# Altium footprint library UWRT_Footprint_Library_2020.PcbLib: 376 footprints (part 17 of 24)
Each footprint in its own frame and in the unit in brackets; x right, y up, seen from the top. Pads: shape width x height; smd on the part's side, far side on the other; paste and mask are expansions set on the pad; w line width, h text height; cw(c..) or ccw(c..) is an arc to the next point about the centre after c.
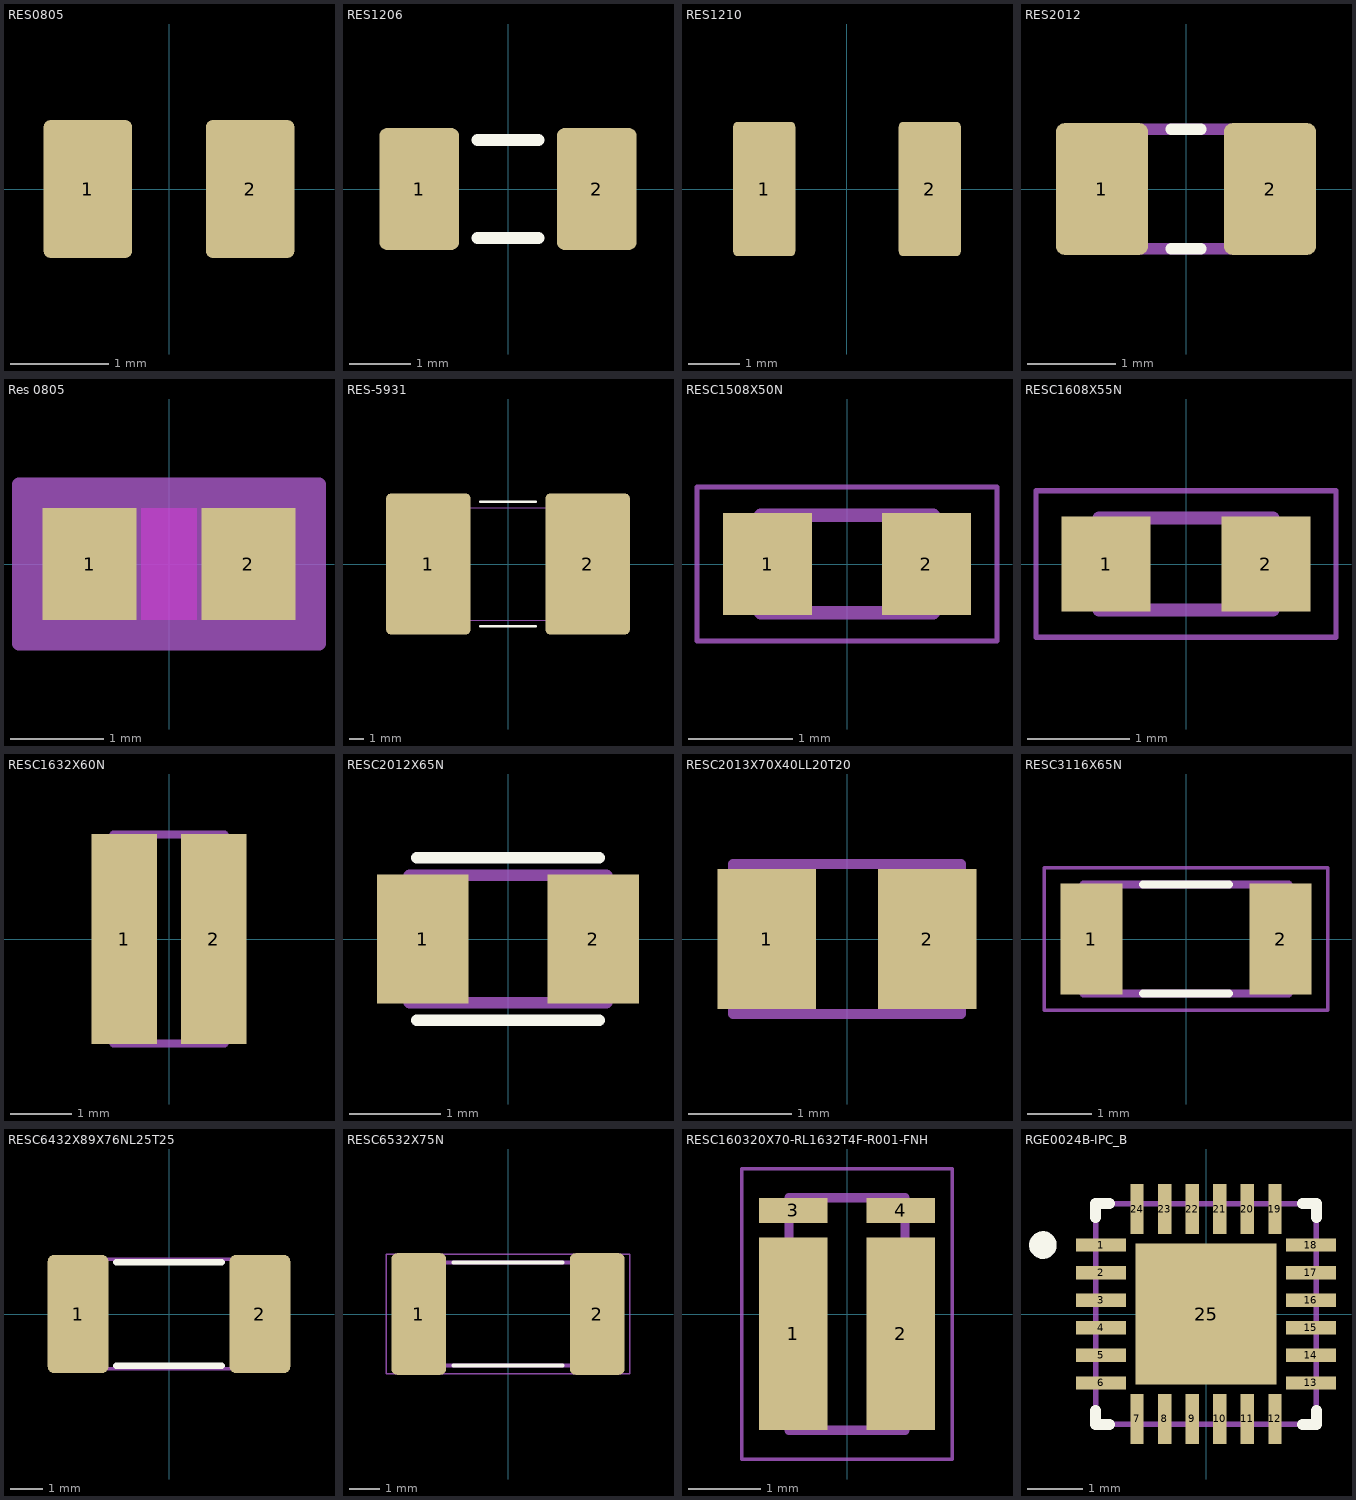
[diagram p16: the footprints below, top view; thin cyan lines are the x and y axes]

## RES0805 [mm] "Chip Resistor, 2-Leads, Body 2.00x1.25mm, IPC High Density"
height 0.5
pads (2):
  rrect15% 0.9x1.4 smd: 1(-0.825,0) 2(0.825,0)
3D body "0805 resistor.step": height 0.61, standoff 0.01, extent -1,-0.625 1,0.625

## RES1206 [mm] "Chip Resistor, Body 3.2x1.6mm, IPC Medium Density"
height 0.75
pads (2):
  rrect20% 1.3x2 smd: 1(-1.45,0) 2(1.45,0)
Top Overlay:
  lines w0.2: -0.5,-0.8 0.5,-0.8 ; -0.5,0.8 0.5,0.8
3D body "1206 resistor.step": height 0.61, standoff 0.01, extent -1.6,-0.8 1.6,0.8

## RES1210 [mm] "Chip Resistor, Body 3.20x2.50mm"
pads (2):
  rrect15% 1.2x2.6 smd: 1(-1.6,0) 2(1.6,0)
3D body "User Library-R_1210.sldprt": height 0.6, standoff 0, extent -1.6,-1.25 1.6,1.25

## RES2012 [mm]
pads (2):
  rrect20% 1.05x1.5 smd: 1(-0.955,0) 2(0.955,0)
Top Overlay:
  lines w0.127: -0.17,-0.68 0.17,-0.68 ; -0.17,0.68 0.17,0.68
Mechanical 4:
  lines w0.127: -1.05,-0.68 -1.05,0.68 ; -1.05,-0.68 1.05,-0.68 ; -1.05,-0.68 -1.05,0.68 ; -1.05,-0.68 1.05,-0.68 ; -1.05,0.68 1.05,0.68 ; -1.05,0.68 1.05,0.68 ; 1.05,-0.68 1.05,0.68 ; 1.05,-0.68 1.05,0.68
3D body "0805 resistor.STEP": height 0.6, standoff 0, extent -1,-0.625 1,0.625

## Res 0805 [mm]
pads (2):
  rect 1.006x1.2 smd paste+0 mask+0: 1(-0.853,0) 2(0.853,0)
Top Layer keep-out:
  region: -0.299,-0.549 -0.299,0.549 0.299,0.549 0.299,-0.549
Keep-Out Layer:
  region: -0.299,-0.6 -0.299,0.6 0.299,0.6 0.299,-0.6
Mechanical 13:
  lines w0.025: -1,-0.6 -1,0.6 ; -1,-0.6 1,-0.6 ; -1,-0.6 -0.35,-0.6 -0.35,0.6 -1,0.6 ; -1,-0.6 -1,0.6 ; -1,0.6 1,0.6 ; 1,-0.6 1,0.6 ; 1,-0.6 1,0.6 ; 1,-0.6 0.35,-0.6 0.35,0.6 1,0.6
Mechanical 15:
  region: 1.61,-0.854 -1.61,-0.854 -1.61,0.854 1.61,0.854
  lines w0.152: -1.61,-0.854 1.61,-0.854 1.61,0.854 -1.61,0.854 -1.61,-0.854
3D body "RC0805N_VIS.step": height 0.71, standoff 0, extent -1,-0.6 1,0.6

## RES-5931 [mm]
pads (2):
  rrect10% 6x10 smd paste+0 mask+0: 1(-5.664,0) 2(5.664,0)
Top Overlay:
  lines w0.152: -2,-4.427 2,-4.427 ; -2,4.427 2,4.427
Mechanical 13:
  circle w0: c-5.537,0 r0.076
  lines w0.025: -7.633,-4 -7.633,4 ; -7.633,-4 7.633,-4 ; -7.633,-4 -3.391,-4 -3.391,4 -7.633,4 ; -7.633,-4 -7.633,4 ; -7.633,4 7.633,4 ; 7.633,-4 7.633,4 ; 7.633,-4 7.633,4 ; 7.633,-4 3.391,-4 3.391,4 7.633,4
3D body "User Library-WSSL5931.step": height 2.36, standoff 0.01, extent -7.5,-3.875 7.5,3.875

## RESC1508X50N [mm]
pads (2):
  rect 0.86x0.98 smd: 1(-0.765,0) 2(0.765,0)
Mechanical 13:
  lines w0.127: -0.83,-0.47 0.83,-0.47 0.83,0.47 -0.83,0.47 -0.83,-0.47
Mechanical 15:
  lines w0.05: -1.444,-0.74 1.444,-0.74 1.444,0.74 -1.444,0.74 -1.444,-0.74

## RESC1608X55N [mm]
pads (2):
  rect 0.87x0.93 smd: 1(-0.78,0) 2(0.78,0)
Mechanical 13:
  lines w0.127: -0.85,-0.45 0.85,-0.45 0.85,0.45 -0.85,0.45 -0.85,-0.45
Mechanical 15:
  lines w0.05: -1.465,-0.715 1.465,-0.715 1.465,0.715 -1.465,0.715 -1.465,-0.715

## RESC1632X60N [mm]
pads (2):
  rect 1.06x3.42 smd: 1(-0.728,0) 2(0.728,0)
Mechanical 13:
  lines w0.127: -0.9,-1.7 0.9,-1.7 0.9,1.7 -0.9,1.7 -0.9,-1.7
3D body "PRL1632-R016-F-T1.STEP": height 0.6, standoff 0, extent -0.798,-1.619 0.802,1.581

## RESC2012X65N [mm]
pads (2):
  rect 1x1.42 smd: 1(-0.935,0) 2(0.935,0)
Top Overlay:
  lines w0.127: -1,-0.89 1,-0.89 ; -1,0.89 1,0.89
Mechanical 4:
  lines w0.127: -1.08,-0.7 1.08,-0.7 ; -1.08,-0.7 -1.08,0.7 ; -1.08,-0.7 1.08,-0.7 ; -1.08,-0.7 -1.08,0.7 ; -1.08,0.7 1.08,0.7 ; -1.08,0.7 1.08,0.7 ; 1.08,-0.7 1.08,0.7 ; 1.08,-0.7 1.08,0.7
3D body "1-1614959-4--3DModel-STEP-56544.STEP": height 0.6, standoff 0, extent -1,-0.625 1,0.625

## RESC2013X70X40LL20T20 [mm] "Chip Resistor, 2-Leads, Body 2.00x1.25mm, IPC High Density"
height 0.7
pads (2):
  rect 0.95x1.35 smd: 1(-0.775,0) 2(0.775,0)
Mechanical 13:
  lines w0.1: -1.1,-0.725 1.1,-0.725 1.1,0.725 -1.1,0.725 -1.1,-0.725
3D body: height 0.7, standoff 0, extent 0.7,-0.725 1.1,0.725
3D body: height 0.7, standoff 0, extent -1.1,-0.725 -0.7,0.725
3D body: height 0.7, standoff 0, extent -0.7,-0.725 0.7,0.725

## RESC3116X65N [mm]
pads (2):
  rect 0.97x1.73 smd: 1(-1.48,0) 2(1.48,0)
Top Overlay:
  lines w0.127: -0.67,-0.85 0.67,-0.85 ; -0.67,0.85 0.67,0.85
Mechanical 13:
  lines w0.127: -1.6,-0.85 -1.6,0.85 1.6,0.85 1.6,-0.85 -1.6,-0.85
Mechanical 15:
  lines w0.05: -2.215,-1.115 -2.215,1.115 2.215,1.115 2.215,-1.115 -2.215,-1.115
3D body "step_temp.STEP": height 0.65, standoff 0, extent -1.55,-0.8 1.55,0.8

## RESC6432X89X76NL25T25 [mm] "Chip Resistor, 2-Leads, Body 6.6x3.43mm, IPC Medium Density"
height 0.89
pads (2):
  rrect20% 1.9x3.7 smd: 1(-2.85,0) 2(2.85,0)
Top Overlay:
  lines w0.2: -1.65,-1.625 1.65,-1.625 ; -1.65,1.625 1.65,1.625
Mechanical 13:
  lines w0.1: -3.3,-1.715 -3.3,1.715 3.3,1.715 3.3,-1.715 -3.3,-1.715
3D body "DIOC6432X09N.step": height 0.89, standoff 0, extent -3.3,-1.715 3.3,1.715

## RESC6532X75N [mm]
pads (2):
  rrect20% 1.8x4 smd: 1(-2.935,0) 2(2.935,0)
Top Overlay:
  lines w0.127: -1.79,-1.7 1.79,-1.7 ; -1.79,1.7 1.79,1.7
Mechanical 4:
  lines w0.127: -3.4,-1.7 3.4,-1.7 ; -3.4,-1.7 -3.4,1.7 ; -3.4,-1.7 3.4,-1.7 ; -3.4,-1.7 -3.4,1.7 ; -3.4,1.7 3.4,1.7 ; -3.4,1.7 3.4,1.7 ; 3.4,-1.7 3.4,1.7 ; 3.4,-1.7 3.4,1.7
Mechanical 16:
  lines w0.05: -4.005,-1.958 4.005,-1.958 4.005,1.958 -4.005,1.958 -4.005,-1.958
3D body "2512 Model.STEP": height 0.65, standoff 0, extent -3.175,-1.6 3.175,1.6

## RESC160320X70-RL1632T4F-R001-FNH [mm]
pads (4):
  rect 0.94x2.65 smd: 1(-0.74,-0.275) 2(0.74,-0.275)
  rect 0.94x0.35 smd: 3(-0.74,1.425) 4(0.74,1.425)
Mechanical 13:
  lines w0.01: 0.82,1.04 0.82,1.05
  lines w0.127: -0.8,-1.6 -0.8,1.6 0.8,1.6 0.8,-1.6 -0.8,-1.6
Mechanical 15:
  lines w0.05: -1.45,-2 -1.45,2 1.45,2 1.45,-2 -1.45,-2

## RGE0024B-IPC_B [mm]
pads (25):
  rect 0.91x0.242 smd paste+0 mask+0: 1(-1.901,1.25) 2(-1.901,0.75) 3(-1.901,0.25) 4(-1.901,-0.25) 5(-1.901,-0.75) 6(-1.901,-1.25) 13(1.901,-1.25) 14(1.901,-0.75) 15(1.901,-0.25) 16(1.901,0.25) 17(1.901,0.75) 18(1.901,1.25)
  rect 0.242x0.91 smd paste+0 mask+0: 7(-1.25,-1.901) 8(-0.75,-1.901) 9(-0.25,-1.901) 10(0.25,-1.901) 11(0.75,-1.901) 12(1.25,-1.901) 19(1.25,1.901) 20(0.75,1.901) 21(0.25,1.901) 22(-0.25,1.901) 23(-0.75,1.901) 24(-1.25,1.901)
  rect 2.55x2.55 smd paste-1.262 mask+0: 25(0,0)
Top Overlay:
  circle w0.25: c-2.956,1.25 r0.125
  lines w0.2: -2,-1.75 -2,-2 -1.75,-2 ; -2,1.75 -2,2 -1.75,2 ; 1.75,-2 2,-2 2,-1.75 ; 1.75,2 2,2 2,1.75
Top Paste:
  region: -0.806,0.806 -0.806,-0.806 0.806,-0.806 0.806,0.806
Mechanical 13:
  lines w0.1: -2,-2 2,-2 2,2 -2,2 -2,-2
  text ".Designator" at 0,-0.635 h1.27
3D body: height 0.25, standoff 0, extent 0,0 0.254,0.254